# Altium footprint library SI944C.PcbLib: 78 footprints (part 3 of 5)
Each footprint in its own frame and in the unit in brackets; x right, y up, seen from the top. Pads: shape width x height; smd on the part's side, far side on the other; paste and mask are expansions set on the pad; w line width, h text height; cw(c..) or ccw(c..) is an arc to the next point about the centre after c.
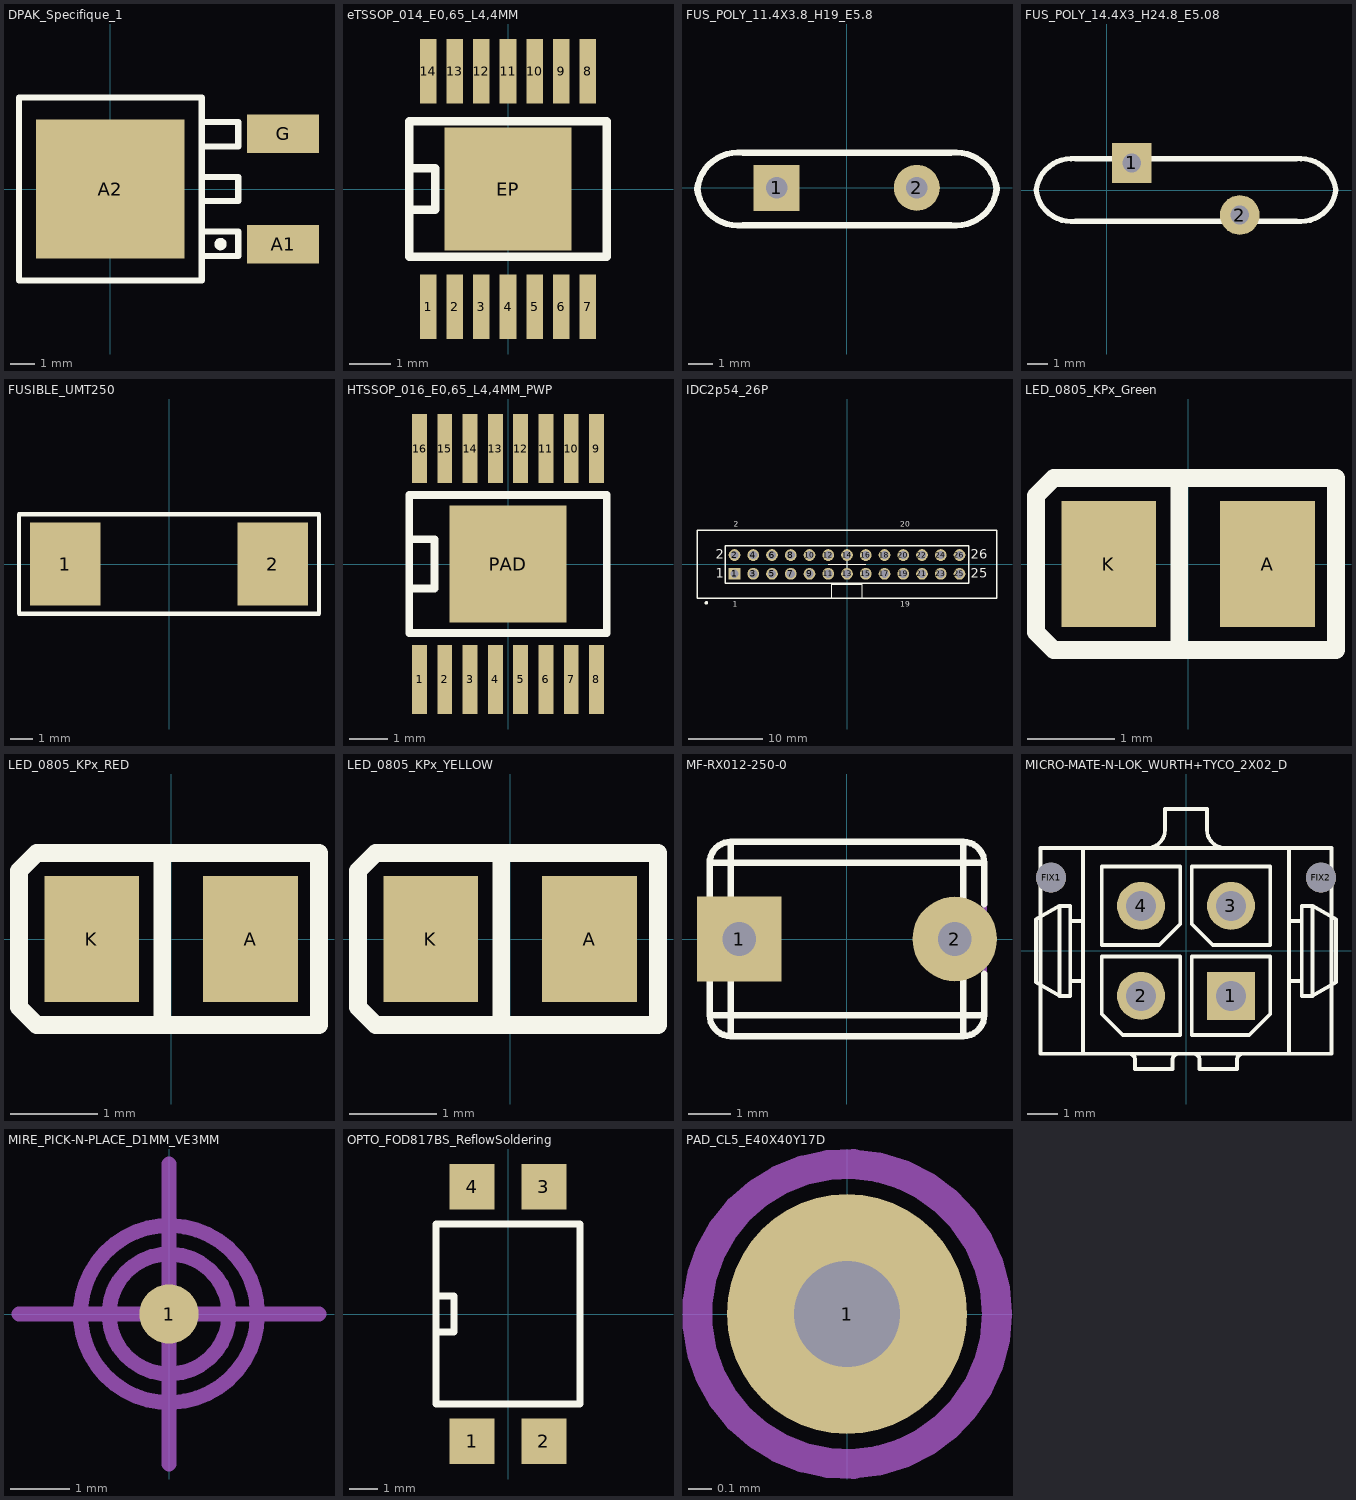
[diagram p2: the footprints below, top view; thin cyan lines are the x and y axes]

## DPAK_Specifique_1 [mm] "2.6 isolation"
pads (3):
  rect 3x1.6 smd paste-0.076: A1(7.2,-2.3) G(7.2,2.3)
  rect 6.198x5.8 smd paste-25.4: A2(0,0)
Top Overlay:
  circle w0.254: c4.595,-2.3 r0.129
  lines w0.254: 3.81,-2.794 5.334,-2.794 5.334,-1.778 3.81,-1.778 ; 3.81,-0.508 5.334,-0.508 5.334,0.508 3.81,0.508 ; 3.81,1.778 5.334,1.778 5.334,2.794 3.81,2.794 ; -3.81,-3.81 -3.81,3.81 3.81,3.81 3.81,-3.81 -3.81,-3.81
Top Paste:
  region: -2.794,-2.794 -0.254,-2.794 -0.254,-0.254 -2.794,-0.254
  region: 0.246,-2.794 2.786,-2.794 2.786,-0.254 0.246,-0.254
  region: -2.794,0.246 -0.254,0.246 -0.254,2.786 -2.794,2.786
  region: 0.246,0.246 2.786,0.246 2.786,2.786 0.246,2.786
3D body "SW3dPS-DPAK-1.STEP": height 2.34, standoff -0.07, extent -2.169,-3.3 7.769,3.24

## eTSSOP_014_E0,65_L4,4MM [mil]
pads (15):
  rect 16x62 smd mask+5: 1(-76.77,-113.19) 2(-51.18,-113.19) 3(-25.59,-113.19) 4(0,-113.19) 5(25.59,-113.19) 6(51.18,-113.19) 7(76.77,-113.19) 8(76.77,113.19) 9(51.18,113.19) 10(25.59,113.19) 11(0,113.19) 12(-25.59,113.19) 13(-51.18,113.19) 14(-76.77,113.19)
  rect 122.05x118.11 smd: EP(0,0)
Top Overlay:
  lines w8: -95,-20 -70,-20 -70,20 -95,20 ; -95,-65 -95,65 95,65 95,-65 -95,-65
3D body "User Library-TSSOP-14 5_1x4_4.STEP": height 43.91, standoff 0.6, extent -100.39,-125.98 100.4,125.99

## FUS_POLY_11.4X3.8_H19_E5.8 [mm]
height 19
pads (2):
  rect 1.905x1.905 hole 0.9: 1(-2.9,0)
  round 1.905 hole 0.9: 2(2.9,0)
Top Overlay:
  lines w0.254: -6.19,-0.05 cw(c-4.495,-0.245) -4.3,1.45 4.32,1.45 cw(c4.515,-0.245) 6.21,-0.05 cw(c4.515,0.145) 4.32,-1.55 -4.3,-1.55 cw(c-4.495,0.145) -6.19,-0.05
3D body: height 5.17, standoff -1.87, extent -5.7,-19.041 5.7,0.33
3D body: height 2, standoff 0, extent -3.793,-0.898 -2,0.898
3D body: height 2, standoff 0, extent 2.007,-0.898 3.8,0.898
3D body: height 0, standoff -3, extent -3.346,-0.449 -2.45,0.449
3D body: height 0, standoff -3, extent 2.454,-0.449 3.35,0.449

## FUS_POLY_14.4X3_H24.8_E5.08 [mm]
height 24.8
pads (2):
  rect 1.905x1.905 hole 0.9: 1(1.2,1.3)
  round 1.905 hole 0.9: 2(6.4,-1.2)
Top Overlay:
  lines w0.254: -3.39,0 ccw(c-1.695,0.195) -1.5,-1.5 9.12,-1.5 ccw(c9.315,0.195) 11.01,0 ccw(c9.315,-0.195) 9.12,1.5 -1.5,1.5 ccw(c-1.695,-0.195) -3.39,0
3D body "SW3dPS-PTCR, 240 V, Raychem LVR025S.STEP": height 9.88, standoff -2.97, extent -0.53,-3.76 8.13,14.91
3D body: height 11.7, standoff -1.3, extent -3.39,-0.75 11.01,18.763

## FUSIBLE_UMT250 [mm]
pads (2):
  rect 3.2x3.75 smd: 1(-4.7,0) 2(4.7,0)
Top Overlay:
  lines w0.203: -6.8,-2.25 -6.8,2.25 6.8,2.25 6.8,-2.25 -6.8,-2.25
3D body "SW3dPS-UMT250.STEP": height 3, standoff 0, extent -5.45,-1.5 5.45,1.5

## HTSSOP_016_E0,65_L4,4MM_PWP [mm]
pads (17):
  rect 0.381x1.778 smd mask+0.152: 1(-2.275,-2.97) 2(-1.625,-2.97) 3(-0.975,-2.97) 4(-0.325,-2.97) 5(0.325,-2.97) 6(0.975,-2.97) 7(1.625,-2.97) 8(2.275,-2.97) 9(2.275,2.97) 10(1.625,2.97) 11(0.975,2.97) 12(0.325,2.97) 13(-0.325,2.97) 14(-0.975,2.97) 15(-1.625,2.97) 16(-2.275,2.97)
  rect 3x3 smd: PAD(0,0)
Top Overlay:
  lines w0.203: -2.54,-0.628 -1.887,-0.628 -1.887,0.636 -2.54,0.636 ; -2.54,-1.778 -2.54,1.778 2.54,1.778 2.54,-1.778 -2.54,-1.778
3D body "SW3dPS-TSSOP-16.STEP": height 1, standoff 0, extent -2.5,-3.2 2.5,3.2

## IDC2p54_26P [mm] "Connector; Header; 13x2 Position"
pads (26):
  rect 1.6x1.6 hole 1.1 mask+0.05: 1(-15.24,-1.27)
  round 1.6 hole 1.1 mask+0.05: 2(-15.24,1.27) 3(-12.7,-1.27) 4(-12.7,1.27) 5(-10.16,-1.27) 6(-10.16,1.27) 7(-7.62,-1.27) 8(-7.62,1.27) 9(-5.08,-1.27) 10(-5.08,1.27) 11(-2.54,-1.27) 12(-2.54,1.27) 13(0,-1.27) 14(0,1.27) 15(2.54,-1.27) 16(2.54,1.27) 17(5.08,-1.27) 18(5.08,1.27) 19(7.62,-1.27) 20(7.62,1.27) 21(10.16,-1.27) 22(10.16,1.27) 23(12.7,-1.27) 24(12.7,1.27) 25(15.24,-1.27) 26(15.24,1.27)
Top Overlay:
  circle w0.25: c-19.048,-5.207 r0.125
  lines w0.025: -2.54,0 2.54,0 ; 0,-1.27 0,1.016
  lines w0.152: -2.05,-4.6 -2.05,-2.7 2.05,-2.7 2.05,-4.6 -2.05,-4.6
  lines w0.2: -20.32,-4.6 20.32,-4.6 20.32,4.6 -20.32,4.6 -20.32,-4.6 ; -16.51,-2.54 16.51,-2.54 16.51,2.54 -16.51,2.54 -16.51,-2.54
  text "1" at -15.494,-5.715 h0.75
  text "2" at -15.367,5.08 h0.75
  text "20" at 7.239,5.08 h0.75
  text "19" at 7.239,-5.715 h0.75
  text "26" at 16.764,0.762 h1.27
  text "25" at 16.764,-1.778 h1.27
  text "1" at -17.78,-1.778 h1.27
  text "2" at -17.78,0.762 h1.27
3D body "STEP-61202621621-rev1.stp": height 8.86, standoff -3.24, extent -20.34,-4.552 20.34,4.548

## LED_0805_KPx_Green [mil]
pads (2):
  rect 43x57 smd paste-3: A(36,0) K(-36,0)
Top Overlay:
  lines w8: -69,30 -69,-31 -61,-39 67,-39 67,39 -61,39 -69,31 ; -4,-39 -4,39
3D body "SW3dPS-led805.STEP": height 43.31, standoff -0.5, extent -40,-25 40,25

## LED_0805_KPx_RED [mil]
pads (2):
  rect 43x57 smd paste-3: A(36,0) K(-36,0)
Top Overlay:
  lines w8: -69,30 -69,-31 -61,-39 67,-39 67,39 -61,39 -69,31 ; -4,-39 -4,39
3D body "SW3dPS-led805R-1.STEP": height 43.31, standoff -0.5, extent -40,-25 40,25

## LED_0805_KPx_YELLOW [mil]
pads (2):
  rect 43x57 smd paste-3: A(36,0) K(-36,0)
Top Overlay:
  lines w8: -69,30 -69,-31 -61,-39 67,-39 67,39 -61,39 -69,31 ; -4,-39 -4,39
3D body "SW3dPS-led805R-1.STEP": height 43.31, standoff -0.5, extent -40,-25 40,25
3D body: height 45.28, standoff 20, extent -30,-25 30,25

## MF-RX012-250-0 [mm] "Resettable Fuses - PPTC 0.12A 60V 4ohm Hold .12 Trip .16"
height 11.5
pads (2):
  rect 2x2 hole 0.8 mask+0.064: 1(-2.55,0)
  round 2 hole 0.8 mask+0.064: 2(2.55,0)
Top Overlay:
  lines w0.152: -3.25,-0.826 -3.25,-1.8 ; -3.25,0.826 -3.25,1.8 ; -2.75,-0.826 -2.75,-2.3 ; -2.75,0.826 -2.75,2.3 ; 2.75,-0.826 2.75,-2.3 ; 2.75,0.826 2.75,1.8 2.75,1.887 2.75,1.971 2.75,2.05 2.75,2.121 2.75,2.183 2.75,2.233 2.75,2.27 2.75,2.292 2.75,2.3 ; 3.25,-0.826 3.25,-1.8 ; 3.25,0.826 3.25,1.8 ; -3.25,-1.8 ccw(c-2.75,-1.8) -2.75,-2.3 ; -3.25,-1.8 3.25,-1.8 ; -3.25,1.8 cw(c-2.75,1.8) -2.75,2.3 ; -3.25,1.8 3.25,1.8 ; -2.75,-2.3 2.75,-2.3 ; -2.75,2.3 2.75,2.3 ; 2.75,-2.3 ccw(c2.75,-1.8) 3.25,-1.8 ; 2.75,2.3 cw(c2.75,1.8) 3.25,1.8
Mechanical 11:
  lines w0.102: -3.24,-1.8 ccw(c-2.74,-1.8) -2.74,-2.3 ; -3.24,-1.8 -3.24,1.8 ; -3.24,-1.8 3.26,-1.8 ; -3.24,1.8 cw(c-2.74,1.8) -2.74,2.3 ; -3.24,1.8 3.26,1.8 ; -2.74,-2.3 2.76,-2.3 ; -2.74,-2.3 -2.74,2.3 ; -2.74,2.3 2.76,2.3 ; 2.76,-2.3 ccw(c2.76,-1.8) 3.26,-1.8 ; 2.76,-2.3 2.76,1.8 2.76,1.887 2.76,1.971 2.76,2.05 2.76,2.121 2.76,2.183 2.76,2.233 2.76,2.27 2.76,2.292 2.76,2.3 ; 2.76,2.3 cw(c2.76,1.8) 3.26,1.8 ; 3.26,-1.8 3.26,1.8
  text ".Designator" at -1.778,-0.762 h2.29
3D body "mf-rx012_250.STEP": height 11.2, standoff -4.7, extent -3.25,-2.304 3.25,2.302

## MICRO-MATE-N-LOK_WURTH+TYCO_2X02_D [mm]
pads (6):
  rect 1.6x1.6 hole 1: 1(1.5,-1.5)
  round 1.6 hole 1: 2(-1.5,-1.5) 3(1.5,1.5) 4(-1.5,1.5)
  round 1 hole 1 unplated: FIX1(-4.5,2.44) FIX2(4.5,2.44)
Top Overlay:
  lines w0.127: -3.86,-1 -3.43,-1 ; -3.86,1 -3.43,1 ; -1.9,-3.43 cw(c-1.9,-3.63) -1.7,-3.63 -1.7,-3.94 -0.45,-3.94 -0.45,-3.63 cw(c-0.25,-3.63) -0.25,-3.43 ; -1.3,3.43 ccw(c-1.3,4.03) -0.7,4.03 -0.7,4.73 0.7,4.73 0.7,4.03 ccw(c1.3,4.03) 1.3,3.43 ; 0.25,-3.43 cw(c0.25,-3.63) 0.45,-3.63 0.45,-3.94 1.7,-3.94 1.7,-3.63 cw(c1.9,-3.63) 1.9,-3.43 ; 3.43,-1 3.86,-1 ; 3.43,1 3.86,1 ; -4.22,-1.5 -4.22,1.5 ; -4.22,-1.5 -5,-1.05 -5,1.05 -4.22,1.5 ; -4.22,-1.5 -3.86,-1.5 -3.86,1.5 -4.22,1.5 ; 4.22,-1.5 3.86,-1.5 3.86,1.5 4.22,1.5 ; 4.22,-1.5 5,-1.05 5,1.05 4.22,1.5 ; 4.22,-1.5 4.22,1.5 ; -4.85,-3.43 -4.85,3.43 4.85,3.43 4.85,-3.43 -4.85,-3.43 ; -3.43,-3.43 3.43,-3.43 3.43,3.43 -3.43,3.43 -3.43,-3.43 ; -2.81,-2.11 -2.11,-2.81 -0.19,-2.81 -0.19,-0.19 -2.81,-0.19 -2.81,-2.11 ; -2.81,0.19 -2.81,2.81 -0.19,2.81 -0.19,0.89 -0.89,0.19 -2.81,0.19 ; 0.19,-2.81 0.19,-0.19 2.81,-0.19 2.81,-2.11 2.11,-2.81 0.19,-2.81 ; 0.19,0.89 0.19,2.81 2.81,2.81 2.81,0.19 0.89,0.19 0.19,0.89
3D body "c-3-794630-4-g-3d.stp": height 9.3, standoff -3.12, extent -5,-3.94 5,4.73

## MIRE_PICK-N-PLACE_D1MM_VE3MM [mm]
pads (1):
  round 1 smd paste-25.4 mask+1: 1(0,0)
Mechanical 10:
  circle w0.254: c0,0 r1.5
  circle w0.254: c0,0 r1.016
  lines w0.254: -2.54,0 2.54,0 ; 0,-2.54 0,2.54

## NULL [mil]

## OPTO_FOD817BS_ReflowSoldering [mil]
height 181.1
pads (4):
  rect 63x63 smd paste-4: 1(-50,-177.17) 2(50,-177.17) 3(50,177.17) 4(-50,177.17)
Top Overlay:
  lines w10: -100,-25 -75,-25 -75,25 -100,25 ; -100,-125 -100,125 100,125 100,-125 -100,-125
3D body: height 185.04, standoff 181.1, extent -82.8,-82.85 -67.12,-67.13
3D body: height 181.1, standoff 0, extent -100,-138.75 100,138.75
3D body: height 177.17, standoff 0, extent -100,-138.75 100,-122.5
3D body "SOIC_pin_2.STEP": height 43.31, standoff 0, extent -57.87,-180.65 -42.13,-137.35
3D body "SOIC_pin_2.STEP": height 43.31, standoff 0, extent 42.13,138 57.87,181.31
3D body "SOIC_pin_2.STEP": height 43.31, standoff 0, extent -57.87,138 -42.13,181.31
3D body "SOIC_pin_2.STEP": height 43.31, standoff 0, extent 42.13,-180.65 57.87,-137.35

## PAD_CL5_E40X40Y17D [mil]
pads (1):
  round 40 hole 17.72: 1(0,0)
Mechanical 13:
  circle w5: c0,0 r25